# Altium footprint library 2228_AlarmeFenetre_Footprints.PcbLib: 25 footprints (part 1 of 2)
Each footprint in its own frame and in the unit in brackets; x right, y up, seen from the top. Pads: shape width x height; smd on the part's side, far side on the other; paste and mask are expansions set on the pad; w line width, h text height; cw(c..) or ccw(c..) is an arc to the next point about the centre after c.
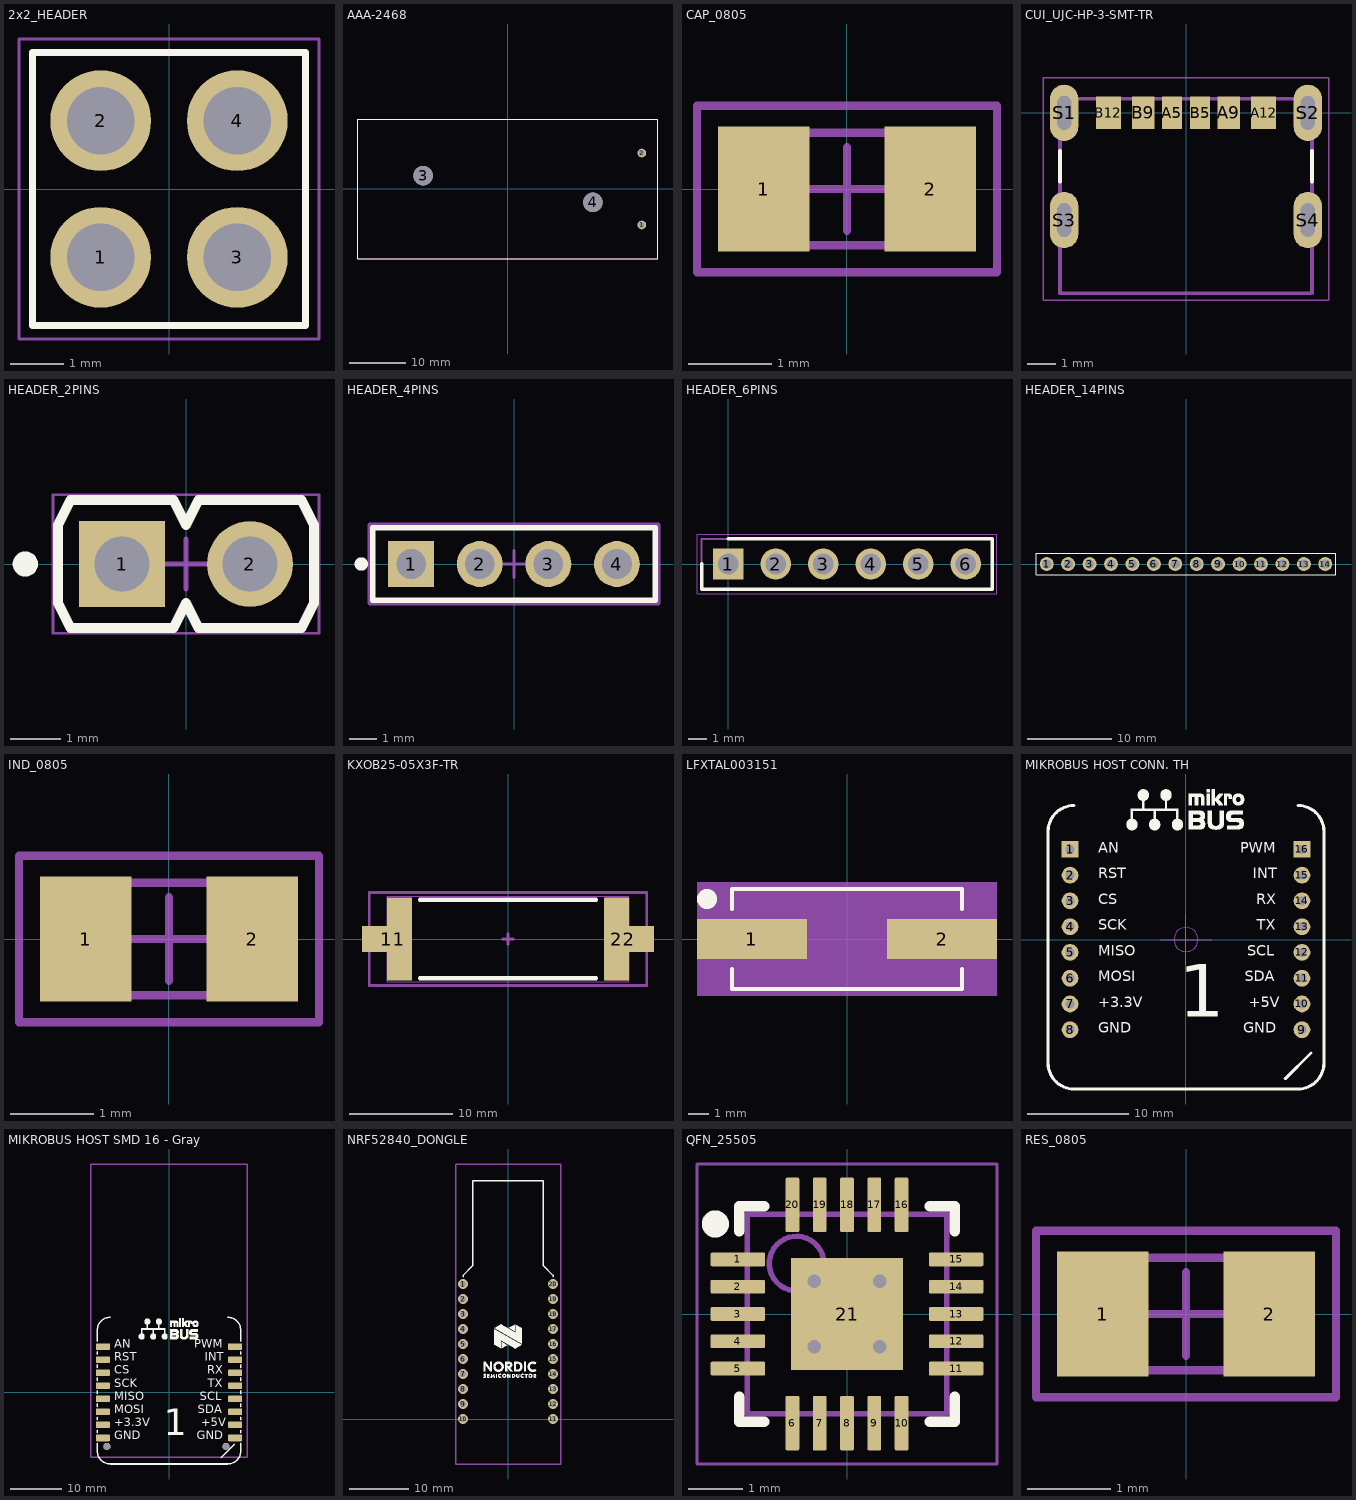
[diagram p0: the footprints below, top view; thin cyan lines are the x and y axes]

## 2x2_HEADER [mm]
height 8.89
pads (4):
  round 1.875 hole 1.25: 1(-1.27,-1.27) 2(-1.27,1.27) 3(1.27,-1.27) 4(1.27,1.27)
Top Overlay:
  lines w0.127: -2.54,-2.54 -2.54,2.54 2.54,2.54 2.54,-2.54 -2.54,-2.54
Mechanical 13:
  lines w0.127: -2.54,-2.54 -2.54,2.54 2.54,2.54 2.54,-2.54 -2.54,-2.54
Mechanical 15:
  lines w0.05: -2.79,-2.79 -2.79,2.79 2.79,2.79 2.79,-2.79 -2.79,-2.79
3D body "61300421121.stp": height 8.54, standoff -3, extent -2.54,-2.54 2.54,2.54

## AAA-2468 [mm]
pads (4):
  round 1.53 hole 1.02: 1(23.625,-6.35) 2(23.625,6.35)
  round 3.45 hole 3.45 unplated: 3(-14.985,2.35) 4(14.985,-2.35)
Top Overlay:
  lines w0.1: -26.49,-12.295 26.49,-12.295 26.49,12.295 -26.49,12.295 -26.49,-12.295
Mechanical 15:
  lines w0.1: -26.49,-12.295 26.49,-12.295 26.49,12.295 -26.49,12.295 -26.49,-12.295
3D body "2468.stp": height 5.8, standoff -4.65, extent -10,-3.376 10,3.376

## CAP_0805 [mm]
height 1.4
pads (2):
  rect 1.1x1.5 smd: 1(-1,0) 2(1,0)
Mechanical 13:
  lines w0.1: -1.075,-0.675 -1.075,0.675 1.075,0.675 1.075,-0.675 -1.075,-0.675
Mechanical 15:
  lines w0.1: -0.5,0 0.5,0 ; 0,-0.5 0,0.5 ; -1.8,-1 -1.8,1 1.8,1 1.8,-1 -1.8,-1
3D body "Ceramic_Capacitor_0805_h32mil.step": height 0.81, standoff 0.01, extent -1,-0.625 1,0.625

## CUI_UJC-HP-3-SMT-TR [mm]
pads (10):
  rect 0.7x1.15 smd: A5(-0.5,0.005) B5(0.5,0.005)
  rect 0.8x1.15 smd: A9(1.52,0.005) B9(-1.52,0.005)
  rect 0.9x1.15 smd: A12(2.75,0.005) B12(-2.75,0.005)
  oval 1x2 hole 0.5 slot 1.2 at 90 deg: S1(-4.32,0) S2(4.32,0) S3(-4.32,-3.8) S4(4.32,-3.8)
Top Overlay:
  lines w0.127: -4.47,-2.45 -4.47,-1.35 ; 4.47,-2.45 4.47,-1.35
Mechanical 13:
  lines w0.127: -4.47,-6.4 -4.47,0.5 4.47,0.5 4.47,-6.4 -4.47,-6.4
Mechanical 15:
  lines w0.05: -5.07,-6.65 -5.07,1.25 5.07,1.25 5.07,-6.65 -5.07,-6.65
3D body "CUI_DEVICES_UJC-HP-3-SMT-TR.step": height 0.63, standoff -3.63, extent -4.47,-6.381 4.47,0.519

## HEADER_2PINS [mm] "Header, 2-Leads, Body 5.08x2.54mm, Pitch 2.54mm"
height 8.54
pads (2):
  rect 1.7x1.7 hole 1.1: 1(-1.27,0)
  round 1.7 hole 1.1: 2(1.27,0)
Top Overlay:
  circle w0.25: c-3.19,0 r0.125
  lines w0.2: -2.54,-0.77 -2.29,-1.27 -0.25,-1.27 0,-0.77 0.25,-1.27 2.29,-1.27 2.54,-0.77 2.54,0.77 2.29,1.27 0.25,1.27 0,0.77 -0.25,1.27 -2.29,1.27 -2.54,0.77 -2.54,-0.77
Mechanical 13:
  lines w0.1: -2.54,-0.77 -2.54,0.77 -2.29,1.27 -0.25,1.27 0,0.77 0.25,1.27 2.29,1.27 2.54,0.77 2.54,-0.77 2.29,-1.27 0.25,-1.27 0,-0.77 -0.25,-1.27 -2.29,-1.27 -2.54,-0.77
Mechanical 15:
  lines w0.05: -2.64,-1.37 -2.64,1.37 2.64,1.37 2.64,-1.37 -2.64,-1.37
  lines w0.1: -0.5,0 0.5,0 ; 0,-0.5 0,0.5
3D body "STEP-61300211121-rev1.stp": height 8.54, standoff -3, extent -2.54,-1.27 2.54,1.27

## HEADER_4PINS [mm]
pads (4):
  rect 1.7x1.7 hole 1.1: 1(-3.81,0)
  round 1.7 hole 1.1: 2(-1.27,0) 3(1.27,0) 4(3.81,0)
Top Overlay:
  circle w0.25: c-5.655,0 r0.125
  lines w0.2: -5.23,-1.345 5.23,-1.345 5.23,1.345 -5.23,1.345 -5.23,-1.345
Mechanical 10:
  lines w0.2: -5.33,-1.445 5.33,-1.445 5.33,1.445 -5.33,1.445 -5.33,-1.445
Mechanical 12:
  lines w0.15: -5.23,-1.345 5.23,-1.345 5.23,1.345 -5.23,1.345 -5.23,-1.345
Mechanical 15:
  lines w0.1: -0.5,0 0.5,0 ; 0,-0.5 0,0.5
  lines w0.2: -5.33,-1.445 5.33,-1.445 5.33,1.445 -5.33,1.445 -5.33,-1.445
3D body "Conn_Wurth_61300411121_eec.STEP": height 0.25, standoff 0, extent -5.33,-1.445 5.33,1.445

## HEADER_6PINS [mm]
pads (6):
  rect 1.65x1.65 / inner round 1.65 / far side rect 1.65x1.65 hole 1.1: 1(0,0)
  round 1.65 hole 1.1: 2(2.54,0) 3(5.08,0) 4(7.62,0) 5(10.16,0) 6(12.7,0)
Top Overlay:
  lines w0.2: -1.42,0 -1.42,-1.345 14.12,-1.345 14.12,1.345 0,1.345
Mechanical 15:
  lines w0.1: -1.42,-1.345 -1.42,1.345 14.12,1.345 14.12,-1.345 -1.42,-1.345
Mechanical 20:
  lines w0.05: -1.67,-1.595 -1.67,1.595 14.37,1.595 14.37,-1.595 -1.67,-1.595
3D body "61300611121.stp": height 8.69, standoff -3.2, extent -1.27,-1.27 13.97,1.27

## HEADER_14PINS [mm]
pads (14):
  round 1.65 hole 1.1: 1(-16.51,0) 2(-13.97,0) 3(-11.43,0) 4(-8.89,0) 5(-6.35,0) 6(-3.81,0) 7(-1.27,0) 8(1.27,0) 9(3.81,0) 10(6.35,0) 11(8.89,0) 12(11.43,0) 13(13.97,0) 14(16.51,0)
Top Overlay:
  lines w0.127: -17.78,-1.27 17.78,-1.27 17.78,1.27 -17.78,1.27 -17.78,-1.27
3D body "61301411121.stp": height 8.54, standoff -3, extent -17.78,-1.27 17.78,1.27

## IND_0805 [mm]
height 1.4
pads (2):
  rect 1.1x1.5 smd: 1(-1,0) 2(1,0)
Mechanical 13:
  lines w0.1: -1.075,-0.675 1.075,-0.675 1.075,0.675 -1.075,0.675 -1.075,-0.675
Mechanical 15:
  lines w0.1: -0.5,0 0.5,0 ; 0,-0.5 0,0.5 ; -1.8,-1 1.8,-1 1.8,1 -1.8,1 -1.8,-1
3D body "L_0805.stp": height 0.61, standoff 0.01, extent -1,-0.625 1,0.625

## KXOB25-05X3F-TR [mm] "Solar Panel, 2-Leads, Body 23,00x8,00mm, IPC Low Density"
height 2.1
pads (4):
  rect 4.8x2.5 smd: 1(-11.7,0) 2(11.7,0)
  rect 2.4x8 smd: 1(-10.5,0) 2(10.5,0)
Top Layer:
  region: 9.5,4 9.5,-4 11.7,-4 11.7,-0.824 13.3,-0.824 13.3,0.7 11.7,0.7 11.7,4
Top Overlay:
  lines w0.4: -8.5,-3.8 8.5,-3.8 ; -8.5,3.8 8.5,3.8
Mechanical 13:
  lines w0.1: -11.65,-4.15 11.65,-4.15 11.65,4.15 -11.65,4.15 -11.65,-4.15
Mechanical 15:
  lines w0.254: -0.5,0 0.5,0 ; 0,-0.5 0,0.5 ; -13.4,-4.5 -13.4,4.5 13.4,4.5 13.4,-4.5 -13.4,-4.5
3D body "Anysolar_KXOB25.step": height 1.9, standoff 0, extent -11.5,-4 11.5,4

## LFXTAL003151 [mm]
pads (2):
  rect 5.5x2 smd paste+0 mask+0: 1(-4.75,0) 2(4.75,0)
Top Overlay:
  circle w0.5: c-7,2 r0.25
  lines w0.2: -5.75,-1.5 -5.75,-2.5 5.75,-2.5 5.75,-1.5 ; -5.75,1.5 -5.75,2.5 5.75,2.5 5.75,1.5
Mechanical 5:
  region: 7.493,-2.832 -7.493,-2.832 -7.493,2.832 7.493,2.832
Mechanical 13:
  circle w0: c-6.579,0 r0.076
  lines w0: -3.251,-2.451 cw(c-3.251,0) -3.251,2.451 ; -3.251,-1.943 cw(c-3.251,0) -3.251,1.943 ; 3.251,-2.451 ccw(c3.251,0) 3.251,2.451 ; 3.251,-1.943 ccw(c3.251,0) 3.251,1.943
  lines w0.025: -3.251,-2.451 3.251,-2.451 ; -3.251,-1.943 3.251,-1.943 ; -3.251,1.943 3.251,1.943 ; -3.251,2.451 3.251,2.451
Mechanical 15:
  region: 7.112,-2.553 -7.112,-2.553 -7.112,2.553 7.112,2.553
  lines w0.152: -7.112,-2.553 -7.112,2.553 7.112,2.553 7.112,-2.553 -7.112,-2.553
3D body: height 0.25, standoff 0, extent 0,0 0.254,0.254
3D body "HC-49US_11P4X3P8_IQD.step": height 2.9, standoff 0, extent -6.706,-2.451 6.706,2.451

## MIKROBUS HOST CONN. TH [mil]
height 47.24
pads (16):
  rect 65x65 hole 35: 1(-450,350) 16(450,350)
  round 65 hole 35: 2(-450,250) 3(-450,150) 4(-450,50) 5(-450,-50) 6(-450,-150) 7(-450,-250) 8(-450,-350) 9(450,-350) 10(450,-250) 11(450,-150) 12(450,-50) 13(450,50) 14(450,150) 15(450,250)
Top Overlay:
  drawing of 2435 lines, arcs and shapes, not listed
  text "SDA" at 227.55,-176.23 h70
  text "RST" at -340.73,223.77 h70
  text "CS" at -340.73,123.77 h70
  text "MISO" at -340.73,-76.23 h70
  text "SCK" at -340.73,23.77 h70
  text "MOSI" at -340.73,-176.23 h70
  text "+3.3V" at -340.73,-276.23 h70
  text "GND" at -340.73,-376.23 h70
  text "SCL" at 236.75,-76.23 h70
  text "INT" at 259.75,223.77 h70
  text "RX" at 271.94,123.77 h70
  text "TX" at 275.43,23.77 h70
  text "GND" at 221.27,-376.23 h70
  text "+5V" at 244.27,-276.23 h70
  text "AN" at -340.73,323.77 h70
  text "PWM" at 210.05,323.77 h70
  text "1" at -27.77,-367 h350
Mechanical 15:
  circle w2: c0,0 r46.89
  lines w2: -100,0 100,0 ; 0,-100 0,100
3D body "mikroBUS_TH_Black.stp": height 433.62, standoff -107.77, extent -496.94,-500.66 503.84,400.67

## MIKROBUS HOST SMD 16 - Gray [mm]
height 3.16
pads (18):
  round 1.4 hole 1.4 unplated: 0(-12.094,-10.541) 0(11.106,-10.541)
  rrect20% 2.7x1.3 smd mask+0.076: 1(-12.88,8.89) 2(-12.88,6.35) 3(-12.88,3.81) 4(-12.88,1.27) 5(-12.88,-1.27) 6(-12.88,-3.81) 7(-12.88,-6.35) 8(-12.88,-8.89) 9(12.88,-8.89) 10(12.88,-6.35) 11(12.88,-3.81) 12(12.88,-1.27) 13(12.88,1.27) 14(12.88,3.81) 15(12.88,6.35) 16(12.88,8.89)
Top Overlay:
  drawing of 2451 lines, arcs and shapes, not listed
  text "PWM" at 4.941,8.062 h2.79
  text "AN" at -10.668,8.055 h2.79
  text "+5V" at 6.306,-7.185 h2.79
  text "GND" at 5.378,-9.725 h2.79
  text "TX" at 7.55,0.435 h2.79
  text "RX" at 7.41,2.975 h2.79
  text "INT" at 6.924,5.515 h2.79
  text "SCL" at 6.006,-2.105 h2.79
  text "GND" at -10.668,-9.725 h2.79
  text "+3.3V" at -10.668,-7.185 h2.79
  text "MOSI" at -10.668,-4.705 h2.79
  text "SCK" at -10.668,0.435 h2.79
  text "MISO" at -10.668,-2.105 h2.79
  text "CS" at -10.668,2.975 h2.79
  text "RST" at -10.668,5.515 h2.79
  text "SDA" at 5.639,-4.645 h2.79
  text "1" at -1.049,-10.16 h8.89
Mechanical 15:
  lines w0.254: -15.24,-12.7 15.24,-12.7 15.24,44.45 -15.24,44.45 -15.24,-12.7
3D body "mikroBUS_SMD_Gray.stp": height 11.01, standoff -1.19, extent -13.716,-11.862 13.744,11.032

## NRF52840_DONGLE [mm]
pads (20):
  round 1.7 hole 1.1: 1(-7.62,22.86) 2(-7.62,20.32) 3(-7.62,17.78) 4(-7.62,15.24) 5(-7.62,12.7) 6(-7.62,10.16) 7(-7.62,7.62) 8(-7.62,5.08) 9(-7.62,2.54) 10(-7.62,0) 11(7.62,0) 12(7.62,2.54) 13(7.62,5.08) 14(7.62,7.62) 15(7.62,10.16) 16(7.62,12.7) 17(7.62,15.24) 18(7.62,17.78) 19(7.62,20.32) 20(7.62,22.86)
Top Overlay:
  drawing of 30 lines, arcs and shapes, not listed
Mechanical 15:
  lines w0.254: -8.89,-7.62 8.89,-7.62 8.89,43.18 -8.89,43.18 -8.89,-7.62
3D body "61301011821.stp": height 5.8, standoff -4.65, extent 4.244,-10 10.996,10
3D body "61301011821.stp": height 5.8, standoff -4.65, extent -10.996,-10 -4.244,10
3D body "400250.step": height 15.5, standoff 10.93, extent -7.62,-5.588 7.62,40.451
3D body "Conn_Wurth_Elektronik_61301011121_eec.STEP": height 14.27, standoff 2.53, extent 6.347,-1.27 8.89,24.13
3D body "Conn_Wurth_Elektronik_61301011121_eec.STEP": height 14.27, standoff 2.53, extent -8.893,-1.27 -6.35,24.13

## QFN_25505 [mm] "QFN, 20-Leads, Body 3,65x3,65mm, Pitch 0,50mm, Thermal Pad 2,05x2,05mm, IPC Low Density"
height 1
pads (21):
  rrect20% 1x0.25 smd mask+0.07: 1(-2,1) 2(-2,0.5) 3(-2,0) 4(-2,-0.5) 5(-2,-1) 11(2,-1) 12(2,-0.5) 13(2,0) 14(2,0.5) 15(2,1)
  rrect20% 0.25x1 smd mask+0.07: 6(-1,-2) 7(-0.5,-2) 8(0,-2) 9(0.5,-2) 10(1,-2) 16(1,2) 17(0.5,2) 18(0,2) 19(-0.5,2) 20(-1,2)
  rect 2.05x2.05 smd: 21(0,0)
via 0.6,-0.6 diameter 0.61 hole 0.25
via -0.6,-0.6 diameter 0.61 hole 0.25
via 0.6,0.6 diameter 0.61 hole 0.25
via -0.6,0.6 diameter 0.61 hole 0.25
Top Overlay:
  circle w0.25: c-2.413,1.651 r0.125
  lines w0.2: -1.975,-1.525 -1.975,-1.975 -1.525,-1.975 ; -1.975,1.525 -1.975,1.975 -1.525,1.975 ; 1.525,-1.975 1.975,-1.975 1.975,-1.525 ; 1.525,1.975 1.975,1.975 1.975,1.525
Top Courtyard:
  lines w0.05: -2.75,-2.75 2.75,-2.75 2.75,2.75 -2.75,2.75 -2.75,-2.75
  lines w0.1: -0.5,0 0.5,0 ; 0,-0.5 0,0.5
Mechanical 13:
  circle w0.1: c-0.925,0.925 r0.5
  lines w0.1: -1.825,-1.825 1.825,-1.825 1.825,1.825 -1.825,1.825 -1.825,-1.825
3D body "RGR20_2P05X2P05_TEX.step": height 1.4, standoff 0, extent -1.88,-1.88 1.88,1.88

## RES_0805 [mm]
height 1.4
pads (2):
  rect 1.1x1.5 smd: 1(-1,0) 2(1,0)
Mechanical 13:
  lines w0.1: -1.075,-0.675 -1.075,0.675 1.075,0.675 1.075,-0.675 -1.075,-0.675
Mechanical 15:
  lines w0.1: -0.5,0 0.5,0 ; 0,-0.5 0,0.5 ; -1.8,-1 -1.8,1 1.8,1 1.8,-1 -1.8,-1
3D body "Resistor_0805_Text.step": height 0.52, standoff 0.01, extent -1,-0.625 1,0.625